# Altium footprint library 1.20-电感.PcbLib: 72 footprints (part 4 of 5)
Each footprint in its own frame and in the unit in brackets; x right, y up, seen from the top. Pads: shape width x height; smd on the part's side, far side on the other; paste and mask are expansions set on the pad; w line width, h text height; cw(c..) or ccw(c..) is an arc to the next point about the centre after c.
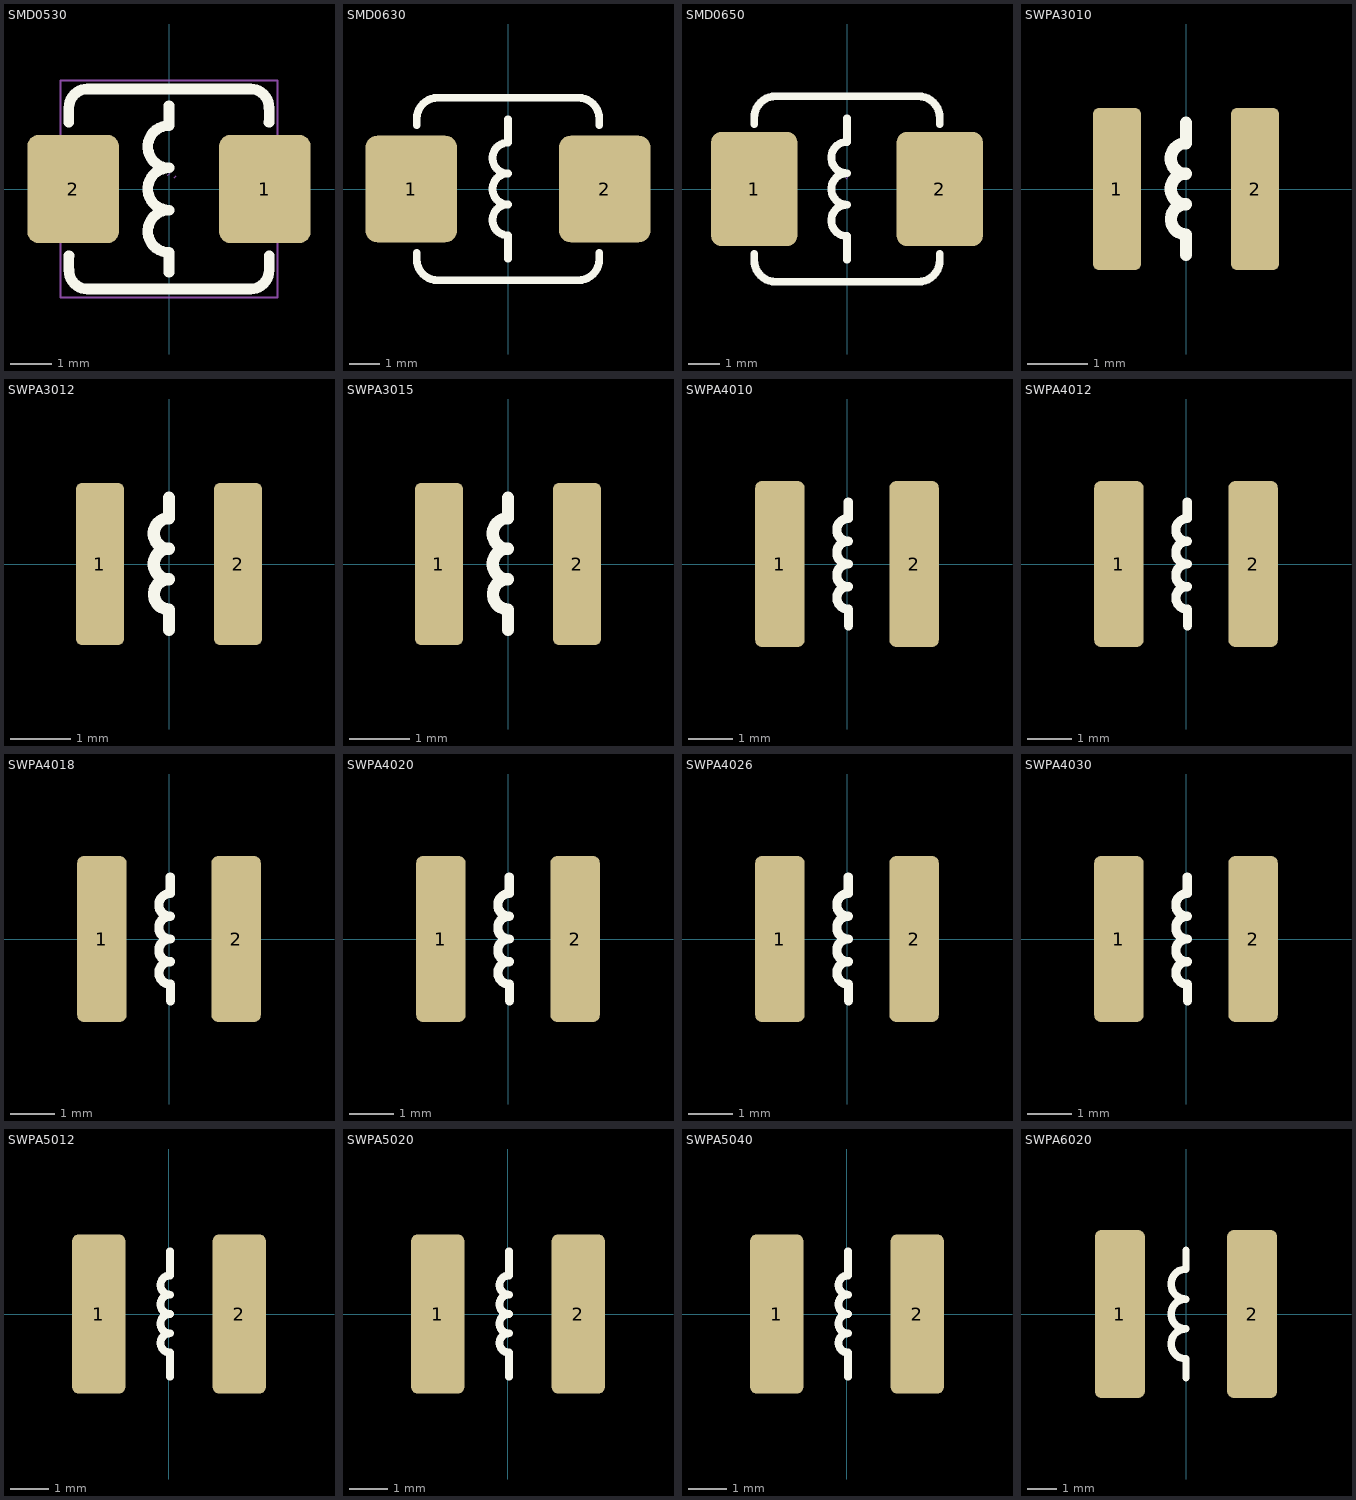
[diagram p3: the footprints below, top view; thin cyan lines are the x and y axes]

## SMD0530 [mm] "一体成型电感，SMD,5.2x5.4x3mm"
pads (2):
  rrect25% 2.2x2.6 smd mask+0.051: 1(2.3,0) 2(-2.3,0)
Top Overlay:
  lines w0.254: -2.403,1.6 -2.403,1.95 cw(c-1.95,1.95) -1.95,2.403 ; -2.4,-1.95 -2.403,-1.95 ; -2.4,-1.6 -2.403,-1.6 -2.403,-1.95 ; -1.95,-2.403 cw(c-1.95,-1.95) -2.403,-1.95 ; -1.95,-2.4 1.95,-2.4 ; -1.95,2.4 1.95,2.4 ; 0,-2 0,-1.524 cw(c0,-1.016) 0,-0.508 cw(c0,0) 0,0.508 cw(c0,1.016) 0,1.524 0,2 ; 1.95,-2.403 ccw(c1.95,-1.95) 2.403,-1.95 2.403,-1.6 ; 1.95,2.403 cw(c1.95,1.95) 2.403,1.95 ; 2.4,1.6 2.403,1.6 2.403,1.95 ; 2.4,1.95 2.403,1.95
Mechanical 15:
  region: 1.5,1.05 2.7,1.05 2.7,-1.05 1.5,-1.05
  region: -2.7,1.05 -1.5,1.05 -1.5,-1.05 -2.7,-1.05
  lines w0.003: -0.025,0.325 0.025,0.376 ; 0.123,0.27 0.173,0.32
  lines w0.051: -2.6,-2.6 -2.6,2.6 2.6,2.6 2.6,-2.6 -2.6,-2.6
3D body "User Library-MWSA0503S.STEP": height 2.9, standoff 0.1, extent -2.9,-2.6 2.9,2.6

## SMD0630 [mm] "一体化成型电感"
pads (2):
  rrect25% 3x3.5 smd: 1(-3.175,0) 2(3.175,0)
Top Overlay:
  lines w0.254: -3,-2.1 -3,-2.3 ccw(c-2.3,-2.3) -2.3,-3 2.3,-3 ccw(c2.3,-2.3) 3,-2.3 3,-2.1 ; -3,2.1 -3,2.3 cw(c-2.3,2.3) -2.3,3 2.3,3 cw(c2.3,2.3) 3,2.3 3,2.1 ; 0,-2.286 0,-1.524 cw(c0,-1.016) 0,-0.508 cw(c0,0) 0,0.508 cw(c0,1.016) 0,1.524 0,2.286
3D body "Smd-0630.STEP": height 3.05, standoff 0.02, extent -3.475,-3.3 3.475,3.3

## SMD0650 [mm] "一体成型电感，SMD,7.1x6.6x5mm"
pads (2):
  rrect25% 2.8x3.7 smd: 1(-3,0) 2(3,0)
Top Overlay:
  lines w0.254: -3,-2.1 -3,-2.3 ccw(c-2.3,-2.3) -2.3,-3 2.3,-3 ccw(c2.3,-2.3) 3,-2.3 3,-2.1 ; -3,2.1 -3,2.3 cw(c-2.3,2.3) -2.3,3 2.3,3 cw(c2.3,2.3) 3,2.3 3,2.1 ; 0,-2.286 0,-1.524 cw(c0,-1.016) 0,-0.508 cw(c0,0) 0,0.508 cw(c0,1.016) 0,1.524 0,2.286
Mechanical 15:
  lines w0.003: -0.025,0.325 0.025,0.376
3D body "744373490082.x_t": height 4.79, standoff -0.01, extent -3.65,-3.3 3.65,3.3

## SWPA3010 [mm] "轮廓3mm*3mm ，焊盘间距1.5mm"
height 1
pads (2):
  rrect25% 0.8x2.7 smd: 1(-1.15,0) 2(1.15,0)
Top Overlay:
  lines w0.203: 0,-1.1 0,-0.758 ; 0,-0.254 cw(c0,0) 0,0.254 cw(c0,0.508) 0,0.762 ; 0.002,-0.758 cw(c0.002,-0.504) 0.002,-0.25 ; 0.002,0.762 0.002,1.104
3D body "3010.stp": height 1.05, standoff 0.03, extent -1.5,-1.5 1.5,1.5

## SWPA3012 [mm] "轮廓3mm*3mm ，焊盘间距1.5mm          淘宝ID:黄晶宝石"
height 1.2
pads (2):
  rrect25% 0.8x2.7 smd: 1(-1.15,0) 2(1.15,0)
Top Overlay:
  lines w0.203: 0,-1.1 0,-0.758 ; 0,-0.254 cw(c0,0) 0,0.254 cw(c0,0.508) 0,0.762 ; 0.002,-0.758 cw(c0.002,-0.504) 0.002,-0.25 ; 0.002,0.762 0.002,1.104
3D body "3012.STEP": height 1.2, standoff -0.02, extent -1.5,-1.5 1.5,1.5

## SWPA3015 [mm] "轮廓3mm*3mm ，焊盘间距1.5mm          淘宝ID:黄晶宝石"
height 1.5
pads (2):
  rrect25% 0.8x2.7 smd: 1(-1.15,0) 2(1.15,0)
Top Overlay:
  lines w0.203: 0,-1.1 0,-0.758 ; 0,-0.254 cw(c0,0) 0,0.254 cw(c0,0.508) 0,0.762 ; 0.002,-0.758 cw(c0.002,-0.504) 0.002,-0.25 ; 0.002,0.762 0.002,1.104
3D body "3015.STEP": height 1.5, standoff -0.02, extent -1.5,-1.5 1.5,1.5

## SWPA4010 [mm] "轮廓4mm*4mm ，焊盘间距1.9mm"
height 1
pads (2):
  rrect25% 1.1x3.7 smd: 1(-1.5,0) 2(1.5,0)
Top Overlay:
  lines w0.203: 0.027,-0.508 cw(c0.027,-0.254) 0.027,0 cw(c0.027,0.254) 0.027,0.508 cw(c0.027,0.762) 0.027,1.016 0.027,1.382 ; 0.029,-1.378 0.029,-1.012 cw(c0.029,-0.758) 0.029,-0.504
3D body "4010.STEP": height 1, standoff -0.02, extent -2,-2 2,2

## SWPA4012 [mm] "轮廓4mm*4mm ，焊盘间距1.9mm"
height 1.2
pads (2):
  rrect25% 1.1x3.7 smd: 1(-1.5,0) 2(1.5,0)
Top Overlay:
  lines w0.203: 0.027,-0.508 cw(c0.027,-0.254) 0.027,0 cw(c0.027,0.254) 0.027,0.508 cw(c0.027,0.762) 0.027,1.016 0.027,1.382 ; 0.029,-1.378 0.029,-1.012 cw(c0.029,-0.758) 0.029,-0.504
3D body "4012.STEP": height 1.2, standoff -0.02, extent -2,-2 2,2

## SWPA4018 [mm] "轮廓4mm*4mm ，焊盘间距1.9mm          淘宝ID:黄晶宝石"
height 1.8
pads (2):
  rrect25% 1.1x3.7 smd: 1(-1.5,0) 2(1.5,0)
Top Overlay:
  lines w0.203: 0.027,-0.508 cw(c0.027,-0.254) 0.027,0 cw(c0.027,0.254) 0.027,0.508 cw(c0.027,0.762) 0.027,1.016 0.027,1.382 ; 0.029,-1.378 0.029,-1.012 cw(c0.029,-0.758) 0.029,-0.504
3D body "4018.STEP": height 1.8, standoff -0.02, extent -2,-2 2,2

## SWPA4020 [mm] "轮廓4mm*4mm ，焊盘间距1.9mm          淘宝ID:黄晶宝石"
height 2
pads (2):
  rrect25% 1.1x3.7 smd: 1(-1.5,0) 2(1.5,0)
Top Overlay:
  lines w0.203: 0.027,-0.508 cw(c0.027,-0.254) 0.027,0 cw(c0.027,0.254) 0.027,0.508 cw(c0.027,0.762) 0.027,1.016 0.027,1.382 ; 0.029,-1.378 0.029,-1.012 cw(c0.029,-0.758) 0.029,-0.504
3D body "4020.STEP": height 2, standoff -0.02, extent -2,-2 2,2

## SWPA4026 [mm] "轮廓4mm*4mm ，焊盘间距1.9mm"
height 2.6
pads (2):
  rrect25% 1.1x3.7 smd: 1(-1.5,0) 2(1.5,0)
Top Overlay:
  lines w0.203: 0.027,-0.508 cw(c0.027,-0.254) 0.027,0 cw(c0.027,0.254) 0.027,0.508 cw(c0.027,0.762) 0.027,1.016 0.027,1.382 ; 0.029,-1.378 0.029,-1.012 cw(c0.029,-0.758) 0.029,-0.504
3D body "4026.STEP": height 2.6, standoff -0.02, extent -2,-2 2,2

## SWPA4030 [mm] "轮廓4mm*4mm ，焊盘间距1.9mm          淘宝ID:黄晶宝石"
height 3
pads (2):
  rrect25% 1.1x3.7 smd: 1(-1.5,0) 2(1.5,0)
Top Overlay:
  lines w0.203: 0.027,-0.508 cw(c0.027,-0.254) 0.027,0 cw(c0.027,0.254) 0.027,0.508 cw(c0.027,0.762) 0.027,1.016 0.027,1.382 ; 0.029,-1.378 0.029,-1.012 cw(c0.029,-0.758) 0.029,-0.504
3D body "4030.STEP": height 3, standoff -0.02, extent -2,-2 2,2

## SWPA5012 [mm] "轮廓5mm*5mm ，焊盘间距2.3mm"
height 1.2
pads (2):
  rrect25% 1.4x4.2 smd: 1(-1.85,0) 2(1.85,0)
Top Overlay:
  lines w0.203: 0.027,-1.651 0.027,-1.016 cw(c0.027,-0.762) 0.027,-0.508 cw(c0.027,-0.254) 0.027,0 cw(c0.027,0.254) 0.027,0.508 cw(c0.027,0.762) 0.027,1.016 0.027,1.651
3D body "5012S.STEP": height 1.2, standoff -0.02, extent -2.5,-2.5 2.5,2.5

## SWPA5020 [mm] "轮廓5mm*5mm ，焊盘间距2.3mm          淘宝ID:黄晶宝石"
height 2
pads (2):
  rrect25% 1.4x4.2 smd: 1(-1.85,0) 2(1.85,0)
Top Overlay:
  lines w0.203: 0.027,-1.651 0.027,-1.016 cw(c0.027,-0.762) 0.027,-0.508 cw(c0.027,-0.254) 0.027,0 cw(c0.027,0.254) 0.027,0.508 cw(c0.027,0.762) 0.027,1.016 0.027,1.651
3D body "5020S.STEP": height 2, standoff -0.02, extent -2.5,-2.5 2.5,2.5

## SWPA5040 [mm] "轮廓5mm*5mm ，焊盘间距2.3mm"
height 4
pads (2):
  rrect25% 1.4x4.2 smd: 1(-1.85,0) 2(1.85,0)
Top Overlay:
  lines w0.203: 0.027,-1.651 0.027,-1.016 cw(c0.027,-0.762) 0.027,-0.508 cw(c0.027,-0.254) 0.027,0 cw(c0.027,0.254) 0.027,0.508 cw(c0.027,0.762) 0.027,1.016 0.027,1.651
3D body "5040S.STEP": height 4, standoff -0.02, extent -2.5,-2.5 2.5,2.5

## SWPA6020 [mm] "轮廓6mm*6mm ，焊盘间距2.8mm"
height 2
pads (2):
  rrect25% 1.7x5.7 smd: 1(-2.25,0) 2(2.25,0)
Top Overlay:
  lines w0.254: 0,-2.16 0,-1.6 ; 0,-1.524 cw(c0,-1.016) 0,-0.508 cw(c0,0) 0,0.508 cw(c0,1.016) 0,1.524 ; 0,1.6 0,2.16
3D body "6020S.STEP": height 2, standoff -0.02, extent -3,-3 3,3